# Altium footprint library pcb_Active.PcbLib: 86 footprints (part 2 of 6)
Each footprint in its own frame and in the unit in brackets; x right, y up, seen from the top. Pads: shape width x height; smd on the part's side, far side on the other; paste and mask are expansions set on the pad; w line width, h text height; cw(c..) or ccw(c..) is an arc to the next point about the centre after c.
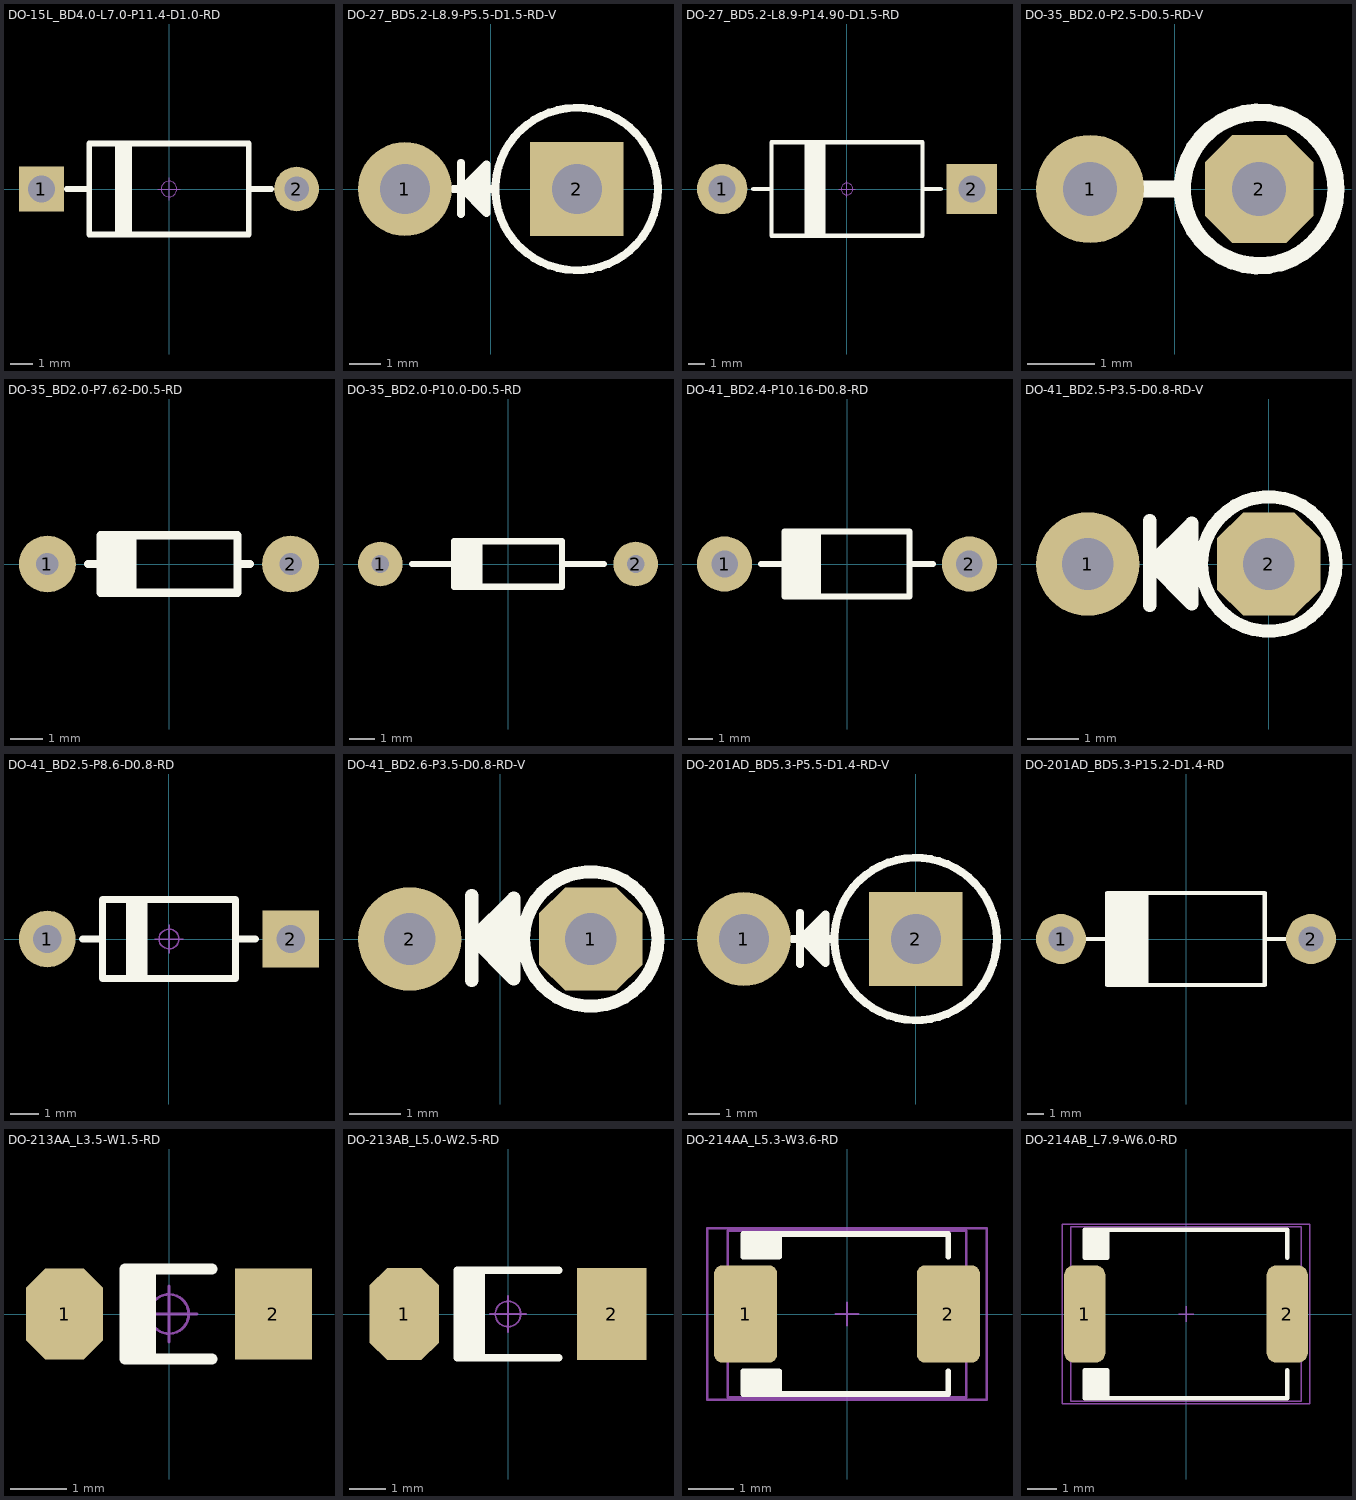
[diagram p1: the footprints below, top view; thin cyan lines are the x and y axes]

## DO-15L_BD4.0-L7.0-P11.4-D1.0-RD [mm] "4*11.4mm(直径，脚距）"
pads (2):
  rect 2x2 hole 1.2: 1(-5.7,0)
  round 2 hole 1.1: 2(5.7,0)
Top Overlay:
  rectangle: -2.286,-2.032 -1.778,2.032
  lines w0.254: -4.572,0 -3.556,0 ; -2.286,-2.032 -2.286,2.032 ; -2.032,-2.032 -2.032,2.032 ; -1.778,-2.032 -1.778,2.032 ; 3.556,0 4.572,0 ; -3.556,-2.032 -3.556,2.032 3.556,2.032 3.556,-2.032 -3.556,-2.032
Mechanical 15:
  circle w0.05: c0,0 r0.35
  lines w0.05: -0.5,0 0.5,0 ; 0,-0.5 0,0.5
Mechanical 16:
  text ".Designator" at 0,0 h1
3D body "DO-15L.STEP": height 4.05, standoff -3.45, extent -6.1,-1.99 6.1,1.99

## DO-27_BD5.2-L8.9-P5.5-D1.5-RD-V [mm] "5.2*5.5mm(直径，脚距）"
pads (2):
  round 3 hole 1.6: 1(-2.75,0)
  rect 3x3 hole 1.6: 2(2.75,0)
Top Overlay:
  circle w0.254: c2.75,0 r2.6
  lines w0.254: -1.187,0 -0.806,0 ; -0.948,-0.805 -0.948,0.841 ; -0.948,0 0.134,0 ; -0.948,0.038 -0.135,-0.775 -0.135,0.792 -0.908,0.02 ; -0.552,0.254 -0.552,0 -0.552,-0.254 -0.806,0 ; -0.298,-0.559 -0.323,0.432 -0.806,0
Mechanical 16:
  text ".Designator" at 0,0 h1
3D body "DO-27-V.STEP": height 11.7, standoff -3.46, extent -3.4,-2.59 5.351,2.6

## DO-27_BD5.2-L8.9-P14.90-D1.5-RD [mm] "5.2*14.9mm(直径，脚距）"
pads (2):
  round 3 hole 1.6: 1(-7.45,0)
  rect 3x3 hole 1.6: 2(7.45,0)
Top Overlay:
  region: -1.27,2.794 -2.54,2.794 -2.54,-2.794 -1.27,-2.794
  lines w0.254: -5.588,0 -4.572,0 ; 4.572,0 5.588,0 ; -4.5,-2.794 -4.5,2.794 4.5,2.794 4.5,-2.794 -4.5,-2.794
Mechanical 15:
  circle w0.05: c0,0 r0.35
  lines w0.05: -0.5,0 0.5,0 ; 0,-0.5 0,0.5
Mechanical 16:
  text ".Designator" at 0,0 h1
3D body "DO-27.STEP": height 5.25, standoff -3.46, extent -8.1,-2.59 8.1,2.59

## DO-35_BD2.0-P2.5-D0.5-RD-V [mm] "1.8*2.5mm(直径，脚距）"
pads (2):
  round 1.6 hole 0.8: 1(-1.25,0)
  oct 1.6x1.6 hole 0.8: 2(1.25,0)
Top Overlay:
  circle w0.254: c1.25,0 r1.136
  lines w0.254: -0.528,0 0.114,0
Mechanical 16:
  text ".Designator" at 0,0 h1
3D body "DO-35-V.STEP": height 5.15, standoff -3.5, extent -1.5,-0.894 2.151,0.9

## DO-35_BD2.0-P7.62-D0.5-RD [mil] "DO-35"
height 70.87
pads (2):
  round 70 hole 27.56: 1(-150,0) 2(150,0)
Top Overlay:
  lines w10: -100,0 -84.65,0 ; -84.65,35.43 -84.65,-35.43 84.65,-35.43 84.65,35.43 ; -83.66,35.43 83.66,35.43 ; -76.77,-35.43 -76.77,35.43 ; -68.9,-35.43 -68.9,35.43 ; -61.02,-35.43 -61.02,35.43 ; -53.15,-35.43 -53.15,35.43 ; -45.28,-35.43 -45.28,35.43 ; 84.65,0 100,0
Mechanical 16:
  text ".Designator" at 0,0 h39.37
3D body "DO-35 300mils.STEP": height 76.38, standoff -99.21, extent -160.24,-39.88 160.24,35.16

## DO-35_BD2.0-P10.0-D0.5-RD [mil] "DO-35"
height 70.87
pads (2):
  round 70 hole 27.56: 1(-200,0) 2(200,0)
Top Overlay:
  lines w10: -150,0 -84.65,0 ; -84.65,35.43 -84.65,-35.43 84.65,-35.43 84.65,35.43 ; -83.66,35.43 83.66,35.43 ; -76.77,-35.43 -76.77,35.43 ; -68.9,-35.43 -68.9,35.43 ; -61.02,-35.43 -61.02,35.43 ; -53.15,-35.43 -53.15,35.43 ; -45.28,-35.43 -45.28,35.43 ; 84.65,0 150,0
Mechanical 16:
  text ".Designator" at 0,0 h39.37
3D body "DO-35.STEP": height 68.75, standoff -115.75, extent -210.49,-33.32 210.49,35.18

## DO-41_BD2.4-P10.16-D0.8-RD [mil] "DO-41"
height 106.3
pads (2):
  round 90 hole 43.31: 1(-200,0) 2(200,0)
Top Overlay:
  lines w10: -140.16,0 -102.36,0 ; -94.49,-53.15 -94.49,53.15 ; -86.61,-53.15 -86.61,53.15 ; -78.74,-53.15 -78.74,53.15 ; -70.87,-53.15 -70.87,53.15 ; -62.99,-53.15 -62.99,53.15 ; -55.12,-53.15 -55.12,53.15 ; -47.24,-53.15 -47.24,53.15 ; 102.36,0 140.16,0 ; -102.36,-53.15 -102.36,53.15 102.36,53.15 102.36,-53.15 -102.36,-53.15
Mechanical 16:
  text ".Designator" at 0,0 h39.37
3D body "DO-41.STEP": height 107.48, standoff -103.15, extent -216.93,-52.76 216.93,52.76

## DO-41_BD2.5-P3.5-D0.8-RD-V [mm] "2.5*3.5mm(直径，脚距）"
height 2.4
pads (2):
  round 2 hole 1: 1(-3.5,0)
  oct 2x2 hole 1: 2(0,0)
Top Overlay:
  circle w0.254: c0,0 r1.3
  lines w0.254: -2.301,-0.805 -2.301,0.841 ; -2.301,0.038 -1.488,-0.775 -1.488,0.792 -2.261,0.02 ; -1.905,0.254 -1.905,0 -1.905,-0.254 -2.159,0 -1.676,0.432 -1.651,-0.559
Mechanical 16:
  text ".Designator" at -2,0 h1
3D body "DO-41G-V.STEP": height 6.4, standoff -3.5, extent -3.9,-1.242 1.251,1.25

## DO-41_BD2.5-P8.6-D0.8-RD [mm] "2.5*8.6mm(直径，脚距）"
height 2.4
pads (2):
  round 2 hole 1: 1(-4.3,0)
  rect 2x2 hole 1: 2(4.3,0)
Top Overlay:
  region: -0.762,1.397 -1.524,1.397 -1.524,-1.397 -0.762,-1.397
  lines w0.254: -3.048,0 -2.346,0 ; 2.346,0 3.048,0 ; -2.35,-1.397 -2.35,1.397 2.35,1.397 2.35,-1.397 -2.35,-1.397
Mechanical 15:
  circle w0.05: c0,0 r0.35
  lines w0.05: -0.5,0 0.5,0 ; 0,-0.5 0,0.5
Mechanical 16:
  text ".Designator" at 0,0 h1
3D body "DO-41G.STEP": height 2.55, standoff -3.45, extent -4.7,-1.242 4.7,1.242

## DO-41_BD2.6-P3.5-D0.8-RD-V [mm] "2.6*3.5mm(直径，脚距）"
height 2.4
pads (2):
  oct 2x2 hole 1: 1(1.75,0)
  round 2 hole 1: 2(-1.75,0)
Top Overlay:
  circle w0.254: c1.75,0 r1.3
  lines w0.254: -0.551,-0.805 -0.551,0.841 ; -0.551,0.038 0.262,-0.775 0.262,0.792 -0.511,0.02 ; -0.155,0.254 -0.155,0 -0.155,-0.254 -0.409,0 0.074,0.432 0.099,-0.559
Mechanical 16:
  text ".Designator" at 0,0 h1
3D body "DO-41-V.STEP": height 6.9, standoff -3.5, extent -2.15,-1.291 3.051,1.3

## DO-201AD_BD5.3-P5.5-D1.4-RD-V [mm] "5.2*5.5mm(直径，脚距）"
pads (2):
  round 3 hole 1.6: 1(-5.5,0)
  rect 3x3 hole 1.6: 2(0,0)
Top Overlay:
  circle w0.254: c0,0 r2.6
  lines w0.254: -3.937,0 -3.556,0 ; -3.698,-0.805 -3.698,0.841 ; -3.698,0 -2.616,0 ; -3.698,0.038 -2.885,-0.775 -2.885,0.792 -3.658,0.02 ; -3.302,0.254 -3.302,0 -3.302,-0.254 -3.556,0 ; -3.048,-0.559 -3.073,0.432 -3.556,0
Mechanical 16:
  text ".Designator" at -2.5,0 h1
3D body "DO-201AD-V.STEP": height 12, standoff -3.46, extent -6.15,-2.59 2.601,2.6

## DO-201AD_BD5.3-P15.2-D1.4-RD [mil] "DO-201AD"
height 80
pads (2):
  round 120 hole 59.06: 1(-300,0) 2(300,0)
Top Overlay:
  lines w10: -240.16,0 -188.98,0 ; -181.1,-110.24 -181.1,110.24 ; -173.23,-110.24 -173.23,110.24 ; -165.35,-110.24 -165.35,110.24 ; -157.48,-110.24 -157.48,110.24 ; -149.61,-110.24 -149.61,110.24 ; -141.73,-110.24 -141.73,110.24 ; -133.86,-110.24 -133.86,110.24 ; -125.98,-110.24 -125.98,110.24 ; -118.11,-110.24 -118.11,110.24 ; -110.24,-110.24 -110.24,110.24 ; -102.36,-110.24 -102.36,110.24 ; -94.49,-110.24 -94.49,110.24 ; 188.98,0 240.16,0 ; -188.98,-110.24 -188.98,110.24 188.98,110.24 188.98,-110.24 -188.98,-110.24
Mechanical 16:
  text ".Designator" at 0,0 h39.37
3D body "DO-201AD.STEP": height 221.26, standoff -235.43, extent -325.98,-109.77 325.98,109.77

## DO-213AA_L3.5-W1.5-RD [mm] "1.5*3.5mm(直径，脚距）"
pads (2):
  oct 1.37x1.62 smd: 1(-1.855,0)
  rect 1.37x1.62 smd: 2(1.855,0)
Top Overlay:
  region: -0.227,0.8 -0.777,0.8 -0.777,-0.8 -0.227,-0.8
  lines w0.2: 0.762,-0.8 -0.777,-0.8 -0.777,0.8 0.762,0.8
Mechanical 15:
  circle w0.05: c0,0 r0.35
  lines w0.05: -0.5,0 0.5,0 ; 0,-0.5 0,0.5
Mechanical 16:
  text ".Designator" at 0,0 h1
3D body "DO-213AA.STEP": height 1.53, standoff 0.03, extent -1.75,-0.746 1.75,0.745

## DO-213AB_L5.0-W2.5-RD [mm] "2.5*5.6mm(直径，脚距）"
height 2.54
pads (2):
  oct 1.9x2.54 smd: 1(-2.85,0)
  rect 1.9x2.54 smd: 2(2.85,0)
Top Overlay:
  region: -0.635,1.2 -0.85,1.2 -0.85,-1.2 -0.635,-1.2
  region: -0.85,1.2 -1.4,1.2 -1.4,-1.2 -0.85,-1.2
  lines w0.2: 1.4,-1.2 -1.4,-1.2 -1.4,1.2 1.4,1.2
Mechanical 15:
  circle w0.05: c0,0 r0.35
  lines w0.05: -0.5,0 0.5,0 ; 0,-0.5 0,0.5
Mechanical 16:
  text ".Designator" at 0,0 h1
3D body "DO-213AB.STEP": height 2.55, standoff 0.05, extent -2.53,-1.242 2.53,1.242

## DO-214AA_L5.3-W3.6-RD [mil] "SMB"
height 104.33
pads (2):
  rrect25% 55x85 smd mask+2: 1(-88.58,0) 2(88.58,0)
Top Overlay:
  region: -59.5,50 -59.5,70 -90.58,70 -90.58,50
  region: -59.5,-50 -59.5,-70 -90.58,-70 -90.58,-50
  lines w5: -59.5,-70 -59.5,-50 -90.58,-50 -90.58,-70 88.58,-70 88.58,-50 ; -59.5,70 -59.5,50 -90.58,50 -90.58,70 88.58,70 88.58,50
Mechanical 13:
  lines w2: -10,0 10,0 ; 0,-10 0,10 ; -104.33,-72.84 -104.33,72.84 104.33,72.84 104.33,-72.84 -104.33,-72.84
Mechanical 14:
  lines w2: -122,-75 122,-75 122,75 -122,75 -122,-75
Mechanical 16:
  text ".Designator" at 0,0 h39.37
3D body "User Library-DO-214AA_SMB.STEP": height 87.65, standoff -0.97, extent -104.33,-72.84 104.33,72.83

## DO-214AB_L7.9-W6.0-RD [mil] "SMC"
height 98.43
pads (2):
  rrect50% 55x130 smd: 1(-135,0) 2(135,0)
Top Overlay:
  region: -105,112.05 -135,112.05 -135,74.8 -105,74.8
  region: -105,-74.8 -135,-74.8 -135,-112.05 -105,-112.05
  lines w6: -105,-112.05 -105,-74.8 -135,-74.8 -135,-112.05 135,-112.05 135,-74.8 ; -105,112.05 -105,74.8 -135,74.8 -135,112.05 135,112.05 135,75
Mechanical 13:
  lines w2: -10,0 10,0 ; 0,-10 0,10 ; -153.54,-116.14 -153.54,116.14 153.54,116.14 153.54,-116.14 -153.54,-116.14
Mechanical 14:
  lines w2: -165,-120 165,-120 165,120 -165,120 -165,-120
Mechanical 16:
  text ".Designator" at 0,0 h39.37
3D body "User Library-DO-214AB-SMC.STEP": height 94.53, standoff -1.97, extent -153.55,-116.15 153.54,116.14